# Altium footprint library ESKDPcbLib.PcbLib: 608 footprints (part 11 of 38)
Each footprint in its own frame and in the unit in brackets; x right, y up, seen from the top. Pads: shape width x height; smd on the part's side, far side on the other; paste and mask are expansions set on the pad; w line width, h text height; cw(c..) or ccw(c..) is an arc to the next point about the centre after c.
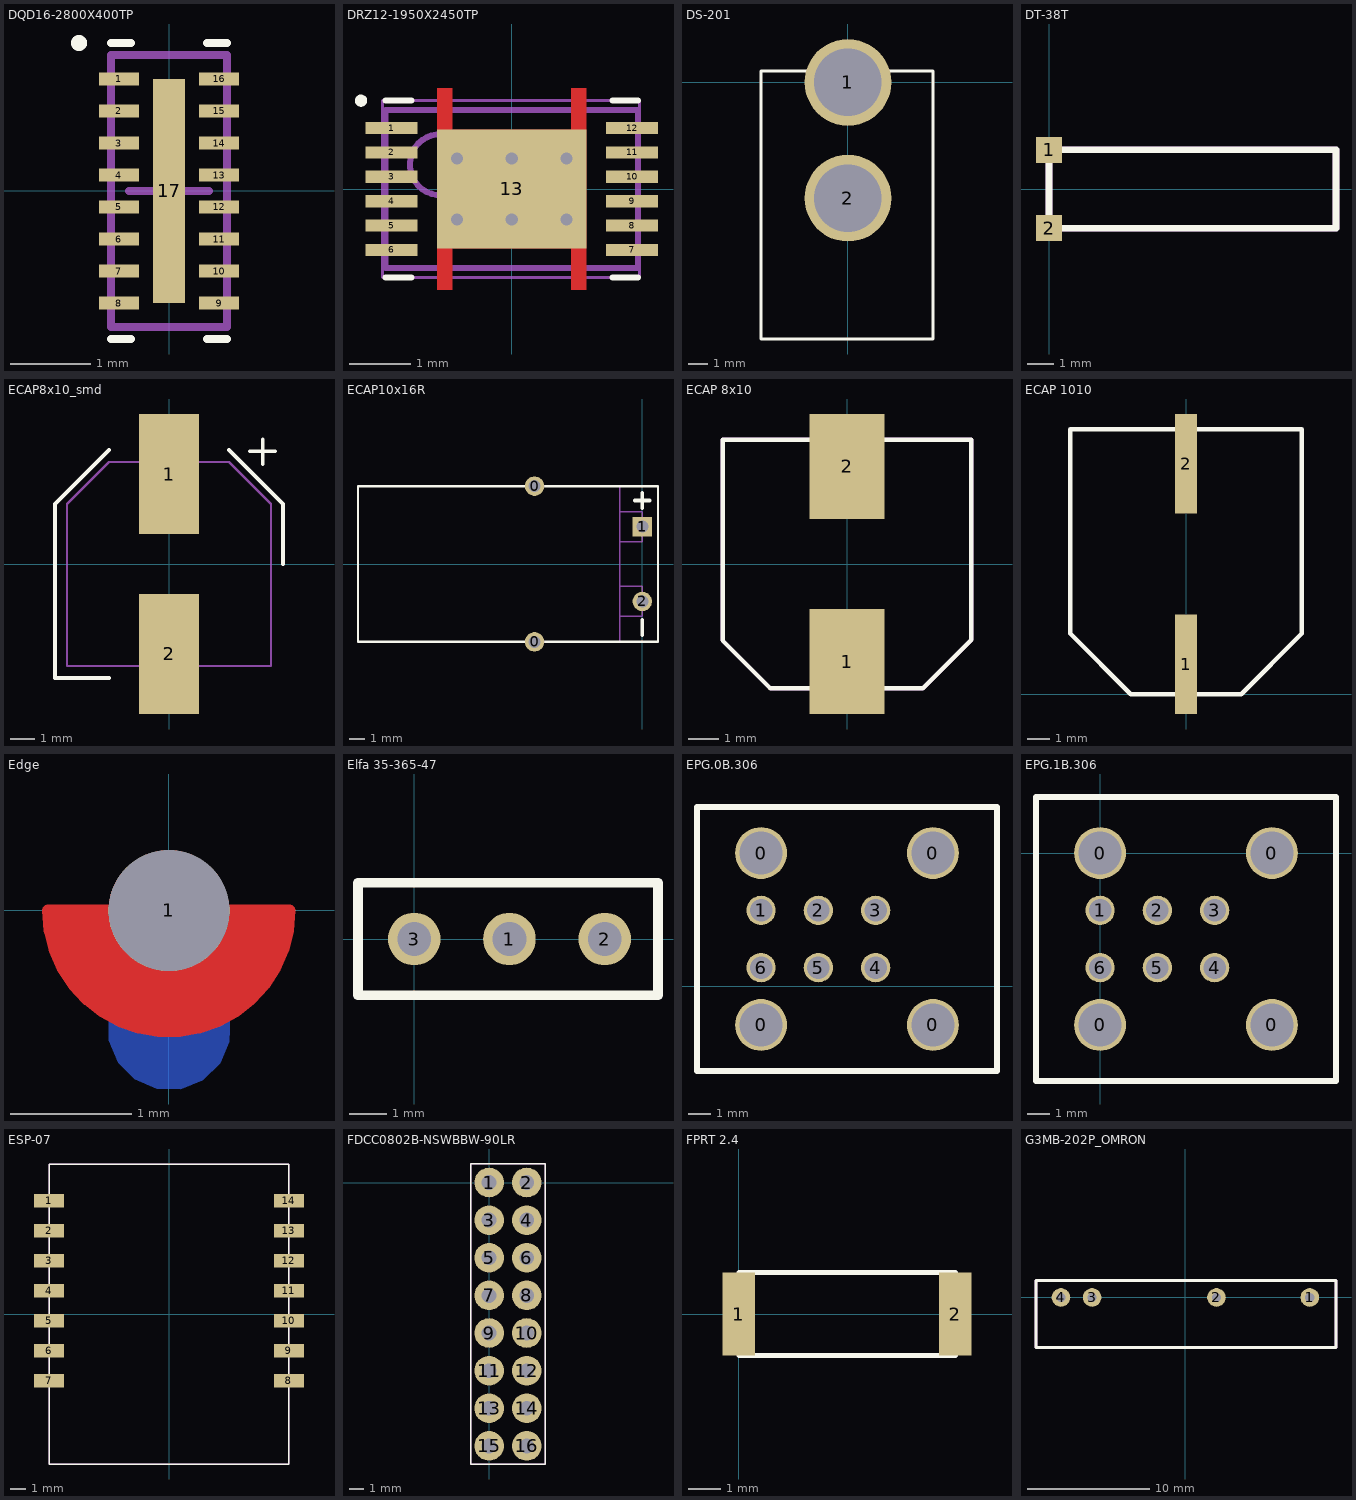
[diagram p10: the footprints below, top view; thin cyan lines are the x and y axes]

## DQD16-2800X400TP [mm] "SON, 16-Leads, Body 1.35x3.3mm, Pitch 0.4mm, Thermal Pad 2.8x0.4mm, TI Recommended"
height 0.8
pads (17):
  rect 0.5x0.16 smd paste+0 mask+0.05: 1(-0.625,1.4) 2(-0.625,1) 3(-0.625,0.6) 4(-0.625,0.2) 5(-0.625,-0.2) 6(-0.625,-0.6) 7(-0.625,-1) 8(-0.625,-1.4) 9(0.625,-1.4) 10(0.625,-1) 11(0.625,-0.6) 12(0.625,-0.2) 13(0.625,0.2) 14(0.625,0.6) 15(0.625,1) 16(0.625,1.4)
  rect 0.4x2.8 smd paste-1.4 mask+0.05: 17(0,0)
Top Overlay:
  circle w0.1: c-1.125,1.85 r0.05
  lines w0.1: -0.725,-1.85 -0.475,-1.85 ; -0.725,1.85 -0.475,1.85 ; 0.475,-1.85 0.725,-1.85 ; 0.475,1.85 0.725,1.85
Top Paste:
  rectangle: -0.15,0.75 0.15,1.35
  region: 0.15,-0.75 -0.15,-0.75 -0.15,-1.35 0.15,-1.35
  region: 0.15,-0.05 -0.15,-0.05 -0.15,-0.65 0.15,-0.65
  rectangle: -0.15,0.05 0.15,0.65
Mechanical 7:
  lines w0.05: -0.725,-1.7 -0.725,1.7 0.725,1.7 0.725,-1.7 -0.725,-1.7
  lines w0.1: -0.5,0 0.5,0 ; 0,-0.5 0,0.5
Mechanical 9:
  lines w0.1: -0.725,-1.7 -0.725,1.7 0.725,1.7 0.725,-1.7 -0.725,-1.7
Mechanical 10:
  text ".Designator" at -0.85,-2.45 h0.7
  text ".Comment" at -0.875,2.15 h0.7
3D body: height 0.8, standoff 0, extent -0.725,-1.7 0.725,1.7

## DRZ12-1950X2450TP [mm] "SON, 12-Leads, Body 4x2.5mm, Pitch 0.4mm, Thermal Pad 1.95x2.45mm, TI Recommended"
height 1
pads (13):
  rect 0.85x0.2 smd paste-0.1 mask+0.05: 1(-1.975,1) 2(-1.975,0.6) 3(-1.975,0.2) 4(-1.975,-0.2) 5(-1.975,-0.6) 6(-1.975,-1) 7(1.975,-1) 8(1.975,-0.6) 9(1.975,-0.2) 10(1.975,0.2) 11(1.975,0.6) 12(1.975,1)
  rect 2.45x1.95 smd paste-0.975 mask+0.05: 13(0,0)
via 0.9,-0.5 diameter 0.5 hole 0.2
via 0.9,0.5 diameter 0.5 hole 0.2
via -0.9,0.5 diameter 0.5 hole 0.2
via 0,0.5 diameter 0.5 hole 0.2
via -0.9,-0.5 diameter 0.5 hole 0.2
via 0,-0.5 diameter 0.5 hole 0.2
Top Layer:
  region: -1.225,-1.65 -1.225,1.65 -0.975,1.65 -0.975,0.975 0.975,0.975 0.975,1.65 1.225,1.65 1.225,-1.65 0.975,-1.65 0.975,-0.975 -0.975,-0.975 -0.975,-1.65
Top Overlay:
  circle w0.1: c-2.475,1.45 r0.05
  lines w0.1: -2.075,-1.45 -1.65,-1.45 ; -2.075,1.45 -1.65,1.45 ; 1.65,-1.45 2.075,-1.45 ; 1.65,1.45 2.075,1.45
Top Paste:
  rectangle: -1.1,0.1 -0.1,0.9
  region: 1.1,0.9 0.1,0.9 0.1,0.1 1.1,0.1
  region: 1.1,-0.1 0.1,-0.1 0.1,-0.9 1.1,-0.9
  rectangle: -1.1,-0.9 -0.1,-0.1
  rectangle: -1.225,1.1 -0.975,1.625
  rectangle: -1.225,-1.625 -0.975,-1.1
  region: 1.225,-1.1 0.975,-1.1 0.975,-1.625 1.225,-1.625
  region: 1.225,1.625 0.975,1.625 0.975,1.1 1.225,1.1
  lines w0.2: -2.275,-1 -1.675,-1 ; -2.275,-0.6 -1.675,-0.6 ; -2.275,-0.2 -1.675,-0.2 ; -2.275,0.2 -1.675,0.2 ; -2.275,0.6 -1.675,0.6 ; -2.275,1 -1.675,1 ; 1.675,-1 2.275,-1 ; 1.675,-0.6 2.275,-0.6 ; 1.675,-0.2 2.275,-0.2 ; 1.675,0.2 2.275,0.2 ; 1.675,0.6 2.275,0.6 ; 1.675,1 2.275,1
Mechanical 7:
  lines w0.05: -2.125,-1.45 -2.125,1.45 2.1,1.45 2.1,-1.45 -2.125,-1.45
  lines w0.1: -0.5,0 0.5,0 ; 0,-0.5 0,0.5
Mechanical 13:
  circle w0.1: c-1.175,0.4 r0.5
  lines w0.1: -2.075,-1.3 -2.075,1.3 2.075,1.3 2.075,-1.3 -2.075,-1.3
3D body: height 1, standoff 0, extent -2.075,-1.3 2.075,1.3

## DS-201 [mm]
pads (2):
  round 4.5 hole 3.5: 1(0,0) 2(0,-6)
Top Overlay:
  lines w0.15: -4.5,-13.3 4.4,-13.3 4.4,0.6 -4.5,0.6 -4.5,-13.3
3D body: height 11, standoff 0, extent -4.5,-13.3 4.4,0.6

## DT-38T [mm]
pads (2):
  rect 1x1 smd: 1(0,1.5) 2(0,-1.5)
Top Overlay:
  lines w0.254: 0,-1.5 0,1.5 11,1.5 11,-1.5 0,-1.5
Mechanical 7:
  lines w0.254: 0,-1.5 0,1.5 11,1.5 11,-1.5 0,-1.5
Mechanical 10:
  text ".Designator" at 0.8,2.975 h1
  text ".Comment" at 0.8,1.975 h1
3D body "DT-38.STEP": height 1.5, standoff -1.95, extent -0.008,-1.5 11.008,1.5

## ECAP8x10_smd [mm]
height 10
pads (2):
  rect 2.5x5 smd: 1(0,3.75) 2(0,-3.75)
Top Overlay:
  lines w0.15: -2.5,-4.75 -4.75,-4.75 -4.75,-4.25 -4.75,2.5 -2.5,4.75 ; 2.5,4.75 4.75,2.5 4.75,0 ; 3.375,4.7 4.425,4.7 ; 3.9,4.15 3.9,5.2
Mechanical 7:
  lines w0.1: -4.25,-4.25 4.25,-4.25 4.25,2.5 2.5,4.25 -2.5,4.25 -4.25,2.5 -4.25,-4.25
Mechanical 10:
  text ".Designator" at -1.05,0.3 h0.8
  text ".Comment" at -1.125,-0.7 h0.6
3D body: height 10.2, standoff 0, extent -4.15,-4.95 4.15,4.95

## ECAP10x16R [mm]
height 10
pads (4):
  round 1.3 hole 0.8: 0(-7.2,-5.2) 0(-7.2,5.2) 2(0,-2.5)
  rect 1.3x1.3 hole 0.8: 1(0,2.5)
Top Overlay:
  lines w0.15: -19,-5.2 1.05,-5.2 1.05,5.2 -19,5.2 -19,-5.2
  lines w0.254: -0.5,4.25 0.5,4.25 ; 0,-4.75 0,-3.75 ; 0,3.75 0,4.75
Mechanical 7:
  lines w0.1: -1.5,-3.5 0,-3.5 0,-1.5 -1.5,-1.5 ; -1.5,1.5 0,1.5 0,3.5 -1.5,3.5 ; -19,-5.2 -19,5.2 -1.5,5.2 -1.5,-5.2 -19,-5.2
Mechanical 10:
  text ".Comment" at -5.875,-1.2 h0.6
  text ".Designator" at -5.8,-0.2 h0.8
3D body: height 5, standoff 0, extent -1.5,-3.5 0,-1.5
3D body: height 5, standoff 0, extent -1.5,1.5 0,3.5
3D body: height 10.39, standoff 0.01, extent -19,-5.2 -1.5,5.159

## ECAP 8x10 [mm]
pads (2):
  rect 2.5x3.5 smd: 1(0,-3.25) 2(0,3.25)
Top Overlay:
  lines w0.15: -4.15,-2.55 -4.15,4.15 4.15,4.15 4.15,-2.525 2.525,-4.15 -2.55,-4.15 -4.15,-2.55
Mechanical 7:
  lines w0.15: -4.15,-2.55 -4.15,4.15 4.15,4.15 4.15,-2.525 2.525,-4.15 -2.55,-4.15 -4.15,-2.55
Mechanical 10:
  text ".Comment" at -0.95,7.375 h1.5
  text ".Designator" at -0.775,5.675 h1.5
3D body: height 10.3, standoff 0.3, extent -3.994,-3.984 3.975,4

## ECAP 1010 [mm]
pads (2):
  rect 1x4.5 smd: 1(0,1.35) 2(0,10.45)
Top Overlay:
  lines w0.2: -5.25,2.75 -2.5,0 0,0 2.5,0 5.25,2.75 5.25,12 -5.25,12 -5.25,2.75
3D body: height 10.8, standoff 0.3, extent -4.96,1.01 5,10.99

## Edge [mm]
pads (1):
  round 1 hole 1: 1(0,0)
Top Layer:
  region: -1,0 -1,-0.132 -0.932,-0.386 -0.8,-0.614 -0.614,-0.8 -0.386,-0.932 -0.132,-1 0.132,-1 0.386,-0.932 0.614,-0.8 0.8,-0.614 0.932,-0.386 1,-0.132 1,0
  lines w0.1: -1,0 ccw(c0,0) 1,0 ; -1,0 0,0 ; -1,0 0,0 ; 0,0 1,0 ; 0,0 1,0
Mid-Layer 1:
  region: -0.998,0.006 -0.998,-0.126 -0.93,-0.38 -0.798,-0.609 -0.612,-0.795 -0.384,-0.926 -0.13,-0.994 0.134,-0.994 0.388,-0.926 0.616,-0.795 0.802,-0.609 0.934,-0.38 1.002,-0.126 1.002,0.005 1.002,0.006
  lines w0.1: -0.998,0.006 ccw(c0.002,0.006) 1.002,0.006 ; -0.998,0.006 0.002,0.006 ; -0.998,0.006 0.002,0.006 ; 0.002,0.006 1.002,0.006 ; 0.002,0.006 1.002,0.006
Mid-Layer 2:
  region: -0.998,0.006 -0.998,-0.126 -0.93,-0.38 -0.798,-0.609 -0.612,-0.795 -0.384,-0.926 -0.13,-0.994 0.134,-0.994 0.388,-0.926 0.616,-0.795 0.802,-0.609 0.934,-0.38 1.002,-0.126 1.002,0.005 1.002,0.006
  lines w0.1: -0.998,0.006 ccw(c0.002,0.006) 1.002,0.006 ; -0.998,0.006 0.002,0.006 ; -0.998,0.006 0.002,0.006 ; 0.002,0.006 1.002,0.006 ; 0.002,0.006 1.002,0.006
Bottom Layer:
  region: -0.497,-0.977 -0.497,-1.076 -0.421,-1.259 -0.282,-1.4 -0.1,-1.477 0.098,-1.478 0.282,-1.405 0.423,-1.267 0.502,-1.085 0.504,-0.986 0.504,0.014 -0.496,0.014

## Elfa 35-365-47 [mm]
pads (3):
  round 1.4 hole 0.9: 1(2.54,0) 2(5.08,0) 3(0,0)
Top Overlay:
  lines w0.254: -1.5,-1.5 6.5,-1.5 6.5,1.5 -1.5,1.5 -1.5,-1.5

## EPG.0B.306 [mm]
pads (10):
  round 2.3 hole 1.9: 0(-13.5,-1.72) 0(-13.5,5.9) 0(-5.88,-1.72) 0(-5.88,5.9)
  round 1.3 hole 1: 1(-13.5,3.36) 2(-10.96,3.36) 3(-8.42,3.36) 4(-8.42,0.82) 5(-10.96,0.82) 6(-13.5,0.82)
Top Overlay:
  lines w0.254: -16.34,-3.76 -16.34,7.94 -3.04,7.94 -3.04,-3.76 -16.34,-3.76

## EPG.1B.306 [mm]
pads (10):
  round 2.3 hole 1.9: 0(0,-7.62) 0(0,0) 0(7.62,-7.62) 0(7.62,0)
  round 1.3 hole 1: 1(0,-2.54) 2(2.54,-2.54) 3(5.08,-2.54) 4(5.08,-5.08) 5(2.54,-5.08) 6(0,-5.08)
Top Overlay:
  lines w0.254: -2.84,-10.11 -2.84,2.49 10.46,2.49 10.46,-10.11 -2.84,-10.11

## ESP-07 [mm]
pads (14):
  rect 2x0.9 smd: 1(-8,7.55) 2(-8,5.55) 3(-8,3.55) 4(-8,1.55) 5(-8,-0.45) 6(-8,-2.45) 7(-8,-4.45) 8(8,-4.45) 9(8,-2.45) 10(8,-0.45) 11(8,1.55) 12(8,3.55) 13(8,5.55) 14(8,7.55)
Top Overlay:
  lines w0.1: -8,-10 -8,10 8,10 8,-10 -8,-10
Mechanical 7:
  lines w0.1: -8,-10 -8,10 8,10 8,-10 -8,-10
Mechanical 10:
  text ".Comment" at 3.155,11.629 h1.52
  text ".Designator" at 3.2,10.55 h1.52

## FDCC0802B-NSWBBW-90LR [mm]
pads (16):
  round 2 hole 1 mask+0: 1(0,0) 2(2.54,0) 3(0,-2.54) 4(2.54,-2.54) 5(0,-5.08) 6(2.54,-5.08) 7(0,-7.62) 8(2.54,-7.62) 9(0,-10.16) 10(2.54,-10.16) 11(0,-12.7) 12(2.54,-12.7) 13(0,-15.24) 14(2.54,-15.24) 15(0,-17.78) 16(2.54,-17.78)
Top Overlay:
  lines w0.1: -1.25,-19 -1.25,1.25 3.8,1.25 3.8,-19 -1.25,-19
Mechanical 7:
  lines w0.1: -1.25,-19 3.8,-19 3.8,1.25 -1.25,1.25 -1.25,-19

## FPRT 2.4 [mm]
pads (2):
  rect 1x2.54 smd mask+0: 1(0,0) 2(6.6,0)
Top Overlay:
  lines w0.15: 0.01,-1.27 0.01,1.27 6.61,1.27 6.61,-1.27 0.01,-1.27
3D body: height 1.7, standoff 0, extent 0.01,-1.27 6.6,1.27

## G3MB-202P_OMRON [mil]
pads (4):
  round 60 hole 30: 1(400,0) 2(100,0) 3(-300,0) 4(-400,0)
Top Overlay:
  lines w10: -480.31,-161.42 -480.31,55.12 484.25,55.12 484.25,-161.42 -480.31,-161.42
Mechanical 7:
  lines w10: -480.31,-161.42 484.25,-161.42 484.25,55.12 -480.31,55.12 -480.31,-161.42
Mechanical 10:
  text ".Designator" at 266.34,150 h39.37
  text ".Comment" at 266.34,110.63 h39.37
3D body: height 807.09, standoff 0, extent -482.28,-161.42 482.28,55.12